# Altium footprint library Component.PcbLib: 115 footprints (part 2 of 8)
Each footprint in its own frame and in the unit in brackets; x right, y up, seen from the top. Pads: shape width x height; smd on the part's side, far side on the other; paste and mask are expansions set on the pad; w line width, h text height; cw(c..) or ccw(c..) is an arc to the next point about the centre after c.
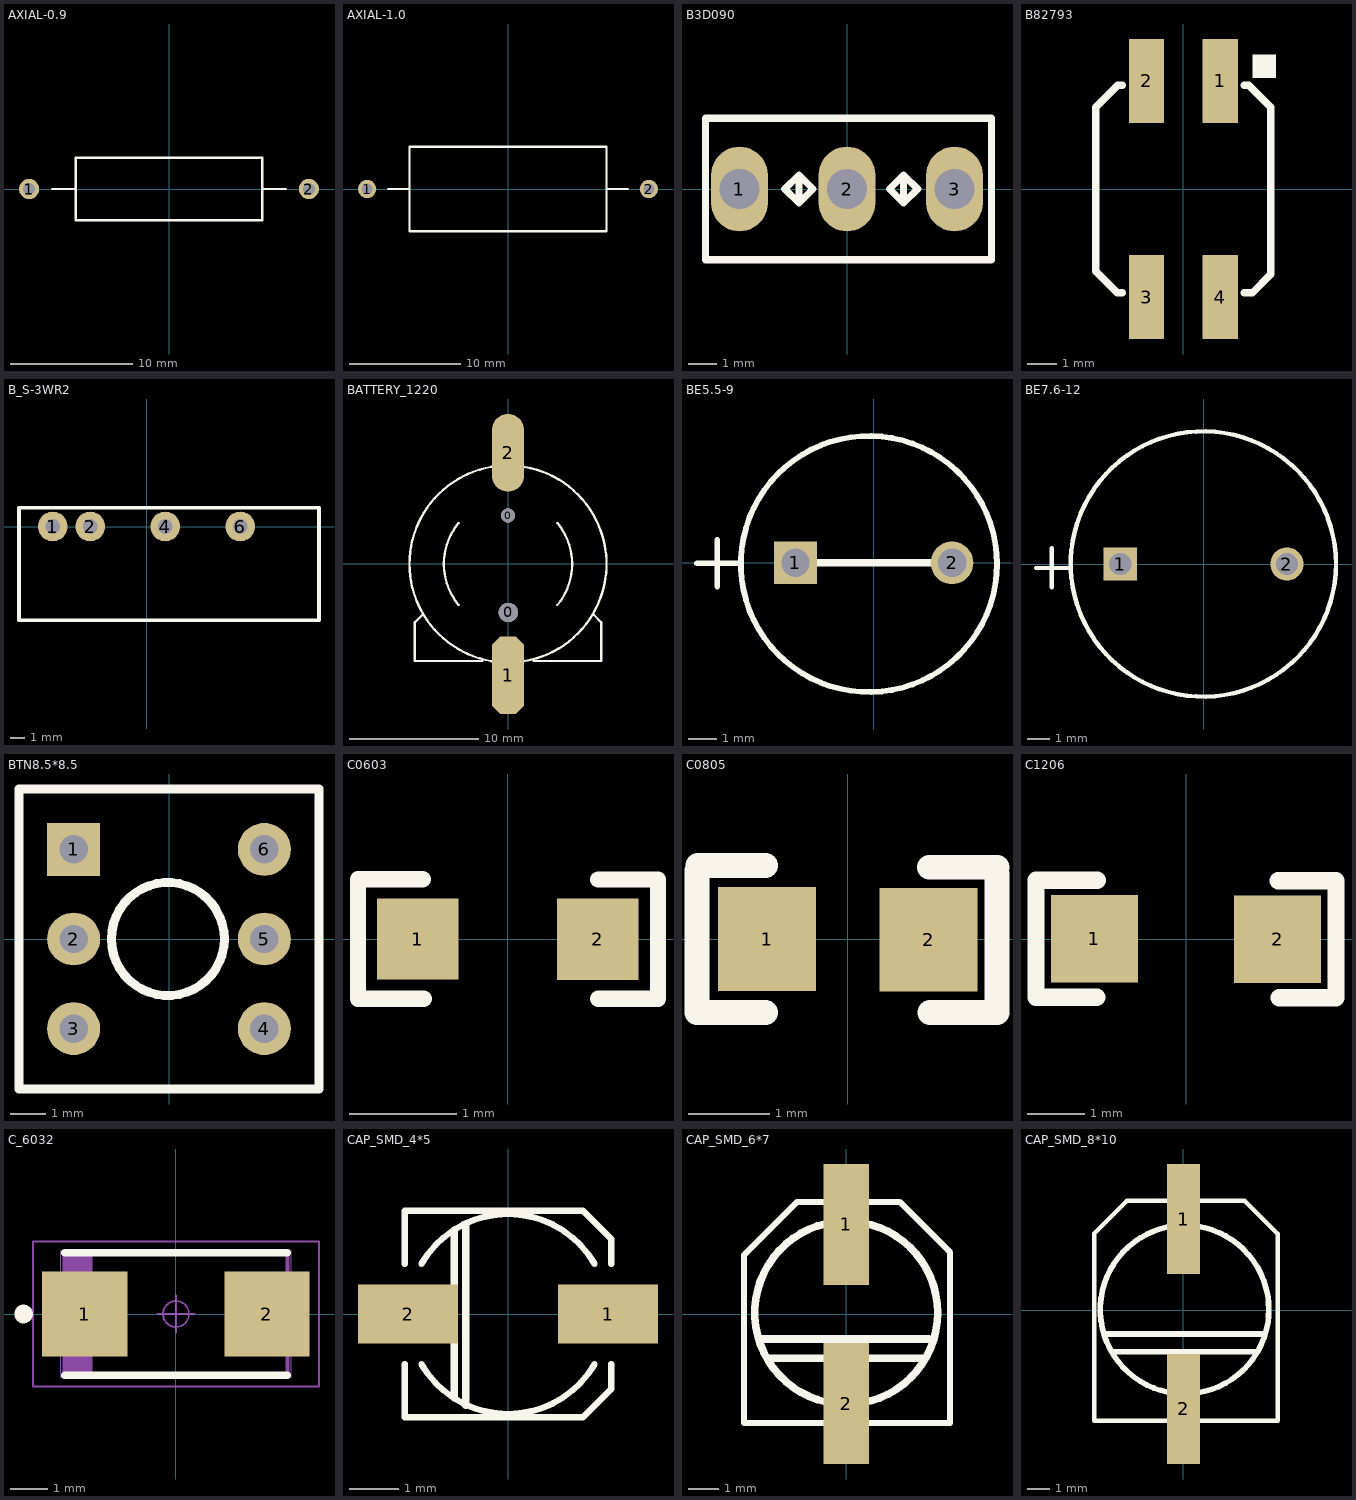
[diagram p1: the footprints below, top view; thin cyan lines are the x and y axes]

## AXIAL-0.9 [mm] "Axial Device, Thru-Hole; 2 Leads; 0.9 in Pin Spacing"
height 5.08
pads (2):
  round 1.65 hole 1: 1(-11.43,0) 2(11.43,0)
Top Overlay:
  lines w0.2: -9.525,0 -7.62,0 ; 7.62,0 9.525,0 ; -7.62,-2.54 -7.62,2.54 7.62,2.54 7.62,-2.54 -7.62,-2.54

## AXIAL-1.0 [mm] "Axial Device, Thru-Hole; 2 Leads; 1.0 in Pin Spacing"
height 7.62
pads (2):
  round 1.65 hole 1: 1(-12.7,0) 2(12.7,0)
Top Overlay:
  lines w0.2: -10.795,0 -8.89,0 ; 8.89,0 10.795,0 ; -8.89,-3.81 8.89,-3.81 8.89,3.81 -8.89,3.81 -8.89,-3.81

## B3D090 [mm]
height 1.99
pads (3):
  oval 2x3 hole 1.4: 1(-3.8,0) 2(0,0) 3(3.8,0)
Top Overlay:
  lines w0.25: -2.2,0 -1.7,-0.5 ; -2.2,0 -2.2,0 ; -2.2,0 -1.7,0.5 ; -1.7,-0.5 -1.2,0 ; -1.7,-0.5 -1.7,0.5 ; -1.7,-0.5 -1.7,0.5 ; -1.7,0.5 -1.7,0.5 ; -1.7,0.5 -1.2,0 ; -1.7,0.5 -1.7,0.5 ; -1.7,0.5 -1.7,0.5 ; -1.7,0.5 -1.7,0.5 ; -1.2,0 -1.2,0 ; 1.5,0 2,0.5 ; 1.5,0 1.5,0 ; 1.5,0 2,-0.5 ; 2,-0.5 2,0.5 ; 2,-0.5 2,0.5 ; 2,-0.5 2.5,0 ; 2,0.5 2,0.5 ; 2,0.5 2,0.5 ; 2,0.5 2,0.5 ; 2,0.5 2.5,0 ; 2,0.5 2,0.5 ; 2.5,0 2.5,0 ; -5,-2.5 -5,2.5 -3.8,2.5 3.8,2.5 5.1,2.5 5.1,-2.5 3.8,-2.5 -3.8,-2.5 -5,-2.5

## B82793 [mm]
height 1.99
pads (4):
  rect 1.2x2.85 smd: 1(1.25,3.675) 2(-1.25,3.675) 3(-1.25,-3.675) 4(1.25,-3.675)
Top Overlay:
  rectangle: 2.355,3.776 3.155,4.576
  lines w0.254: -2.075,-3.525 -2.25,-3.525 -2.975,-2.8 -2.975,2.775 -2.225,3.525 -2.075,3.525 ; 2.075,-3.525 2.35,-3.525 2.975,-2.9 2.975,2.775 2.225,3.525 2.075,3.525

## B_S-3WR2 [mm]
pads (4):
  round 2 hole 1: 1(-6.35,0) 2(-3.81,0) 4(1.27,0) 6(6.35,0)
Top Overlay:
  lines w0.254: -8.636,-6.35 -8.636,1.27 11.684,1.27 11.684,-6.35 -8.636,-6.35
3D body: height 10, standoff -2.5, extent -8.276,-5.994 11.324,1.016

## BATTERY_1220 [mm]
height 1.99
pads (4):
  round 1.1 hole 1.1 unplated: 0(0,3.748)
  round 1.5 hole 1.5 unplated: 0(0.025,-3.752)
  oct 2.5x6 smd: 1(0,-8.602)
  oval 2.5x6 smd: 2(0,8.598)
Top Overlay:
  lines w0.178: -6.6,-3.902 -7.2,-4.502 -7.2,-7.502 -2,-7.502 ; -3.815,-3.171 cw(c0,-0.002) -3.812,3.171 ; -0.833,-7.576 cw(c0,-0.002) -7.62,-0.002 cw(c0,-0.002) -0.833,7.573 ; 0.833,-7.576 ccw(c0,-0.002) 0.833,7.573 ; 2,-7.502 7.2,-7.502 7.2,-4.502 6.625,-3.927 ; 3.81,-3.177 ccw(c0,-0.002) 3.812,3.171
3D body: height 2, standoff 0, extent -7.54,-7.57 7.6,7.6
3D body: height 0.3, standoff 0, extent -0.9,7.6 0.9,10.4
3D body: height 0.3, standoff 0, extent -1.1,-11 1.1,-7.6
3D body: height 2, standoff 0, extent -7.2,-7.502 7.2,-3.9

## BE5.5-9 [mm]
pads (2):
  rect 1.5x1.5 hole 1: 1(-2.75,0)
  round 1.5 hole 1: 2(2.75,0)
Top Overlay:
  circle w0.2: c-0.17,-0.04 r4.5
  lines w0.2: -6.21,-0.01 -4.71,-0.01 ; -5.5,-0.83 -5.5,0.8
  lines w0.254: -2.75,0 2.75,0

## BE7.6-12 [mm]
pads (2):
  rect 1.5x1.5 hole 1: 1(-3.77,0)
  round 1.5 hole 1: 2(3.77,0)
Top Overlay:
  circle w0.2: c-0.01,0 r6
  lines w0.2: -7.58,-0.18 -6.08,-0.18 ; -6.87,-1.05 -6.87,0.71
3D body: height 7.59, standoff -5.5, extent -6.715,-6.89 6.975,6.801

## BTN8.5*8.5 [mm]
pads (6):
  rect 1.5x1.5 hole 0.8: 1(-2.7,2.54)
  round 1.5 hole 0.8: 2(-2.7,0) 3(-2.7,-2.54) 4(2.7,-2.54) 5(2.7,0) 6(2.7,2.54)
Top Overlay:
  circle w0.254: c-0.033,0 r1.6
  lines w0.254: -4.25,-4.25 -4.25,4.25 4.25,4.25 4.25,-4.25 -4.25,-4.25
3D body: height 10, standoff -1.9, extent -2.89,-2.83 2.91,2.97

## C0603 [mil]
pads (2):
  rect 30x30 smd: 1(-33.16,0.03) 2(33.16,-0.03)
Top Overlay:
  lines w6: -31.35,22.08 -55.17,22.08 -55.17,-22.02 -30.96,-22.02 ; 33.21,-22.02 55.26,-22.02 55.26,21.92 33.21,21.92
3D body: height 11.89, standoff 0, extent -31.1,-14.96 31.89,16.54

## C0805 [mm]
pads (2):
  rect 1.2x1.27 smd: 1(-0.99,0.005) 2(0.99,-0.005)
Top Overlay:
  lines w0.305: -1.85,-0.895 -1.85,0.845 ; -1.84,0.905 -1.01,0.905 ; -1.82,-0.895 -1.01,-0.895 ; 1,0.885 1.83,0.885 ; 1.01,-0.895 1.83,-0.895 1.83,0.805
3D body: height 0.78, standoff 0, extent -1.01,-0.61 0.99,0.64

## C1206 [mm]
height 1.99
pads (2):
  rect 1.524x1.524 smd: 1(-1.6,0.005) 2(1.6,-0.005)
Top Overlay:
  lines w0.305: -1.56,-1.015 -2.62,-1.015 -2.62,1.025 ; 1.61,1.015 2.62,1.015 2.62,-1.025 1.63,-1.025 ; -2.62,1.025 -1.55,1.025 -2.62,1.025
3D body: height 1, standoff 0, extent -1.58,-0.79 1.62,0.81

## C_6032 [mm]
pads (2):
  rect 2.3x2.3 smd: 1(-2.45,0) 2(2.45,0)
Top Overlay:
  circle w0.25: c-4.1,0 r0.125
  lines w0.2: -3,-1.65 3,-1.65 ; -3,1.65 3,1.65
Mechanical 1:
  lines w0.1: -2.9,-1.625 -2.9,1.625 ; -2.8,-1.625 -2.8,1.625 ; -2.7,-1.625 -2.7,1.625 ; -2.6,-1.625 -2.6,1.625 ; -2.5,-1.625 -2.5,1.625 ; -2.4,-1.625 -2.4,1.625 ; -2.3,-1.625 -2.3,1.625 ; -3,-1.625 3,-1.625 3,1.625 -3,1.625 -3,-1.625
  text "C1" at -0.537,-0.45 h0.75
Mechanical 16:
  circle w0.05: c0,0 r0.35
  lines w0.001: -3.1,-1.7 3.1,-1.7 3.1,1.7 -3.1,1.7 -3.1,-1.7
  lines w0.05: -0.5,0 0.5,0 ; 0,-0.5 0,0.5 ; -3.85,-1.95 3.85,-1.95 3.85,1.95 -3.85,1.95 -3.85,-1.95

## CAP_SMD_4*5 [mil] "贴片电解电容"
pads (2):
  rect 80x47.24 smd: 1(80,0) 2(-80,0)
Top Overlay:
  lines w5: -82.68,-40 -82.68,-82.68 60,-82.68 ; -82.68,40 -82.68,82.68 60,82.68 ; -69.28,-40 ccw(c0,0) 69.28,-40 ; -69.28,40 cw(c0,0) 69.28,40 ; 35,-82.68 60,-82.68 ; 48,82.68 60,82.68 ; 51,82.68 59,82.68 ; 82.68,-40 82.68,-60 60,-82.68 ; 82.68,40 82.68,60 60,82.68
  lines w6: -43,-67 -43,67 ; -34,-73 -34,71

## CAP_SMD_6*7 [mm] "贴片电解电容"
pads (2):
  rect 1.5x4 smd: 1(0,2.965) 2(0,-2.965)
Top Overlay:
  circle w0.254: c0,0.04 r3.028
  lines w0.2: -3.39,-3.608 3.44,-3.608 3.44,2.037 1.765,3.712 -1.625,3.712 -3.39,1.947 -3.39,-3.608
  lines w0.254: -2.83,-0.83 2.73,-0.83 ; -2.54,-1.46 2.56,-1.46
3D body: height 5.4, standoff 0, extent -3.29,-3.51 3.31,3.49

## CAP_SMD_8*10 [mm] "贴片电解电容"
pads (2):
  rect 1.5x5 smd: 1(0.02,4.15) 2(0.02,-4.47)
Top Overlay:
  circle w0.254: c0.06,0.04 r3.827
  lines w0.2: -4.04,-5.005 -4.04,3.495 -2.56,4.975 2.79,4.975 4.29,3.475 4.29,-5.005 -4.04,-5.005
  lines w0.254: -3.55,-1.07 3.66,-1.07 ; -3.21,-1.88 3.36,-1.88
3D body: height 10.3, standoff -0.2, extent -4.16,-4.86 4.34,4.84